# Altium integrated library Weidmueller_OMNIMATE_Signal.IntLib: 2550 symbols (part 20 of 45)
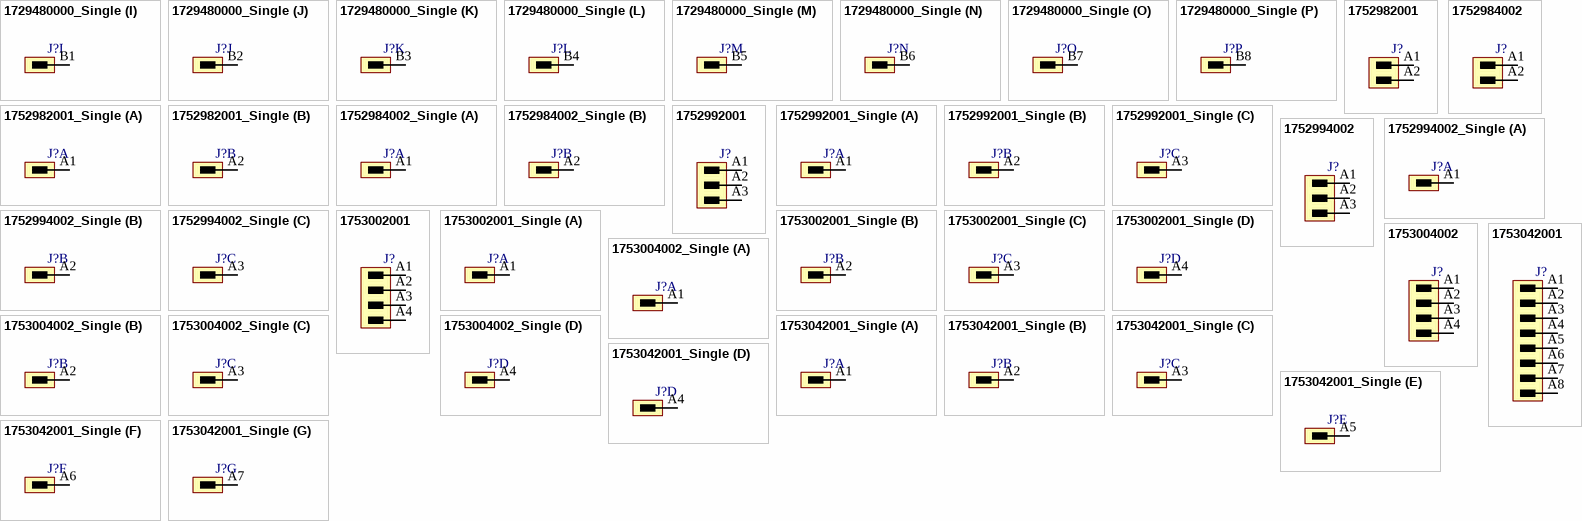
[diagram p230: symbols 1729480000_Single to 1753042001_Single]

## 1752984002_Single
designator J?
OMNIMATE Signal - series BL/SL 3.50; PartNumber: 1752984002; Manufacturer: Weidmueller; Short_text_for_material: SL-SMT 3.50/02/180G 1.5SN BK RL; Side_termination_characteristic: closed side; Mounting_onto_the_PCB: Reflow solder connection; Pitch_mm: 3.5 mm; Pitch_inch: 0.138 inch; No_of_poles: 2; Outgoing_elbow: 180°; Solder_pin_length_mm: 1.5 mm; Contact_surface: tinned; Insulating_material: LCP GF; UL_94_flammability_rating: V-0; Rated_voltage_for_surge_voltage_class_pollution_degree_II_2: 320 V; Rated_current_min_no_of_poles_TU_20_deg_C: 15 A; Rated_voltage_use_group_B_UL_1059: 300 V; Rated_current_use_group_B_UL_1059: 10 A; PackageReference: SL_SMT_3_5_180G_02; Colour: Black; Packaging: Tape; Qty: 265 PCS; Revision: V1; ComponentLink1Description: Manufacturer URL; ComponentLink1URL: http://www.weidmueller.com/; ComponentLink2Description: URL Link1; ComponentLink2URL: http://catalog.weidmueller.com/catalog/Start.do?localeId=en&ObjectID=1752984002
footprint SL_SMT_3_5_180G_02 (OMNIMATE Signal - Serie BL/SL 3.50  SL-SMT 3.50/02/180G 1.5)
part A pins: A1
part B pins: A2

## 1752992001
designator J?
OMNIMATE Signal - series BL/SL 3.50; PartNumber: 1752992001; Manufacturer: Weidmueller; Short_text_for_material: SL-SMT 3.50/03/180G 1.5SN BK BX; Side_termination_characteristic: closed side; Mounting_onto_the_PCB: Reflow solder connection; Pitch_mm: 3.5 mm; Pitch_inch: 0.138 inch; No_of_poles: 3; Outgoing_elbow: 180°; Solder_pin_length_mm: 1.5 mm; Contact_material: CuSn; Contact_surface: tinned; Insulating_material: LCP GF; UL_94_flammability_rating: V-0; Rated_voltage_for_surge_voltage_class_pollution_degree_II_2: 320 V; Rated_voltage_use_group_B_UL_1059: 300 V; Rated_current_use_group_B_UL_1059: 10 A; PackageReference: SL_SMT_3_5_180G_03; Colour: Black; Packaging: Box; Qty: 100 PCS; Revision: V1; ComponentLink1Description: Manufacturer URL; ComponentLink1URL: http://www.weidmueller.com/; ComponentLink2Description: URL Link1; ComponentLink2URL: http://catalog.weidmueller.com/catalog/Start.do?localeId=en&ObjectID=1752992001
footprint SL_SMT_3_5_180G_03 (OMNIMATE Signal - Serie BL/SL 3.50  SL-SMT 3.50/03/180G 1.5)
pins: A1, A2, A3

## 1752992001_Single
designator J?
OMNIMATE Signal - series BL/SL 3.50; PartNumber: 1752992001; Manufacturer: Weidmueller; Short_text_for_material: SL-SMT 3.50/03/180G 1.5SN BK BX; Side_termination_characteristic: closed side; Mounting_onto_the_PCB: Reflow solder connection; Pitch_mm: 3.5 mm; Pitch_inch: 0.138 inch; No_of_poles: 3; Outgoing_elbow: 180°; Solder_pin_length_mm: 1.5 mm; Contact_material: CuSn; Contact_surface: tinned; Insulating_material: LCP GF; UL_94_flammability_rating: V-0; Rated_voltage_for_surge_voltage_class_pollution_degree_II_2: 320 V; Rated_voltage_use_group_B_UL_1059: 300 V; Rated_current_use_group_B_UL_1059: 10 A; PackageReference: SL_SMT_3_5_180G_03; Colour: Black; Packaging: Box; Qty: 100 PCS; Revision: V1; ComponentLink1Description: Manufacturer URL; ComponentLink1URL: http://www.weidmueller.com/; ComponentLink2Description: URL Link1; ComponentLink2URL: http://catalog.weidmueller.com/catalog/Start.do?localeId=en&ObjectID=1752992001
footprint SL_SMT_3_5_180G_03 (OMNIMATE Signal - Serie BL/SL 3.50  SL-SMT 3.50/03/180G 1.5)
part A pins: A1
part B pins: A2
part C pins: A3

## 1752994002
designator J?
OMNIMATE Signal - series BL/SL 3.50; PartNumber: 1752994002; Manufacturer: Weidmueller; Short_text_for_material: SL-SMT 3.50/03/180G 1.5SN BK RL; Side_termination_characteristic: closed side; Mounting_onto_the_PCB: Reflow solder connection; Pitch_mm: 3.5 mm; Pitch_inch: 0.138 inch; No_of_poles: 3; Outgoing_elbow: 180°; Solder_pin_length_mm: 1.5 mm; Contact_surface: tinned; Insulating_material: LCP GF; UL_94_flammability_rating: V-0; Rated_voltage_for_surge_voltage_class_pollution_degree_II_2: 320 V; Rated_current_min_no_of_poles_TU_20_deg_C: 15 A; Rated_voltage_use_group_B_UL_1059: 300 V; Rated_current_use_group_B_UL_1059: 10 A; PackageReference: SL_SMT_3_5_180G_03; Colour: Black; Packaging: Tape; Qty: 265 PCS; Revision: V1; ComponentLink1Description: Manufacturer URL; ComponentLink1URL: http://www.weidmueller.com/; ComponentLink2Description: URL Link1; ComponentLink2URL: http://catalog.weidmueller.com/catalog/Start.do?localeId=en&ObjectID=1752994002
footprint SL_SMT_3_5_180G_03 (OMNIMATE Signal - Serie BL/SL 3.50  SL-SMT 3.50/03/180G 1.5)
pins: A1, A2, A3

## 1752994002_Single
designator J?
OMNIMATE Signal - series BL/SL 3.50; PartNumber: 1752994002; Manufacturer: Weidmueller; Short_text_for_material: SL-SMT 3.50/03/180G 1.5SN BK RL; Side_termination_characteristic: closed side; Mounting_onto_the_PCB: Reflow solder connection; Pitch_mm: 3.5 mm; Pitch_inch: 0.138 inch; No_of_poles: 3; Outgoing_elbow: 180°; Solder_pin_length_mm: 1.5 mm; Contact_surface: tinned; Insulating_material: LCP GF; UL_94_flammability_rating: V-0; Rated_voltage_for_surge_voltage_class_pollution_degree_II_2: 320 V; Rated_current_min_no_of_poles_TU_20_deg_C: 15 A; Rated_voltage_use_group_B_UL_1059: 300 V; Rated_current_use_group_B_UL_1059: 10 A; PackageReference: SL_SMT_3_5_180G_03; Colour: Black; Packaging: Tape; Qty: 265 PCS; Revision: V1; ComponentLink1Description: Manufacturer URL; ComponentLink1URL: http://www.weidmueller.com/; ComponentLink2Description: URL Link1; ComponentLink2URL: http://catalog.weidmueller.com/catalog/Start.do?localeId=en&ObjectID=1752994002
footprint SL_SMT_3_5_180G_03 (OMNIMATE Signal - Serie BL/SL 3.50  SL-SMT 3.50/03/180G 1.5)
part A pins: A1
part B pins: A2
part C pins: A3

## 1753002001
designator J?
OMNIMATE Signal - series BL/SL 3.50; PartNumber: 1753002001; Manufacturer: Weidmueller; Short_text_for_material: SL-SMT 3.50/04/180G 1.5SN BK BX; Side_termination_characteristic: closed side; Mounting_onto_the_PCB: Reflow solder connection; Pitch_mm: 3.5 mm; Pitch_inch: 0.138 inch; No_of_poles: 4; Outgoing_elbow: 180°; Solder_pin_length_mm: 1.5 mm; Contact_material: CuSn; Contact_surface: tinned; Insulating_material: LCP GF; UL_94_flammability_rating: V-0; Rated_voltage_for_surge_voltage_class_pollution_degree_II_2: 320 V; Rated_voltage_use_group_B_UL_1059: 300 V; Rated_current_use_group_B_UL_1059: 10 A; PackageReference: SL_SMT_3_5_180G_04; Colour: Black; Packaging: Box; Qty: 100 PCS; Revision: V1; ComponentLink1Description: Manufacturer URL; ComponentLink1URL: http://www.weidmueller.com/; ComponentLink2Description: URL Link1; ComponentLink2URL: http://catalog.weidmueller.com/catalog/Start.do?localeId=en&ObjectID=1753002001
footprint SL_SMT_3_5_180G_04 (OMNIMATE Signal - Serie BL/SL 3.50  SL-SMT 3.50/04/180G 1.5)
pins: A1, A2, A3, A4

## 1753002001_Single
designator J?
OMNIMATE Signal - series BL/SL 3.50; PartNumber: 1753002001; Manufacturer: Weidmueller; Short_text_for_material: SL-SMT 3.50/04/180G 1.5SN BK BX; Side_termination_characteristic: closed side; Mounting_onto_the_PCB: Reflow solder connection; Pitch_mm: 3.5 mm; Pitch_inch: 0.138 inch; No_of_poles: 4; Outgoing_elbow: 180°; Solder_pin_length_mm: 1.5 mm; Contact_material: CuSn; Contact_surface: tinned; Insulating_material: LCP GF; UL_94_flammability_rating: V-0; Rated_voltage_for_surge_voltage_class_pollution_degree_II_2: 320 V; Rated_voltage_use_group_B_UL_1059: 300 V; Rated_current_use_group_B_UL_1059: 10 A; PackageReference: SL_SMT_3_5_180G_04; Colour: Black; Packaging: Box; Qty: 100 PCS; Revision: V1; ComponentLink1Description: Manufacturer URL; ComponentLink1URL: http://www.weidmueller.com/; ComponentLink2Description: URL Link1; ComponentLink2URL: http://catalog.weidmueller.com/catalog/Start.do?localeId=en&ObjectID=1753002001
footprint SL_SMT_3_5_180G_04 (OMNIMATE Signal - Serie BL/SL 3.50  SL-SMT 3.50/04/180G 1.5)
part A pins: A1
part B pins: A2
part C pins: A3
part D pins: A4

## 1753004002
designator J?
OMNIMATE Signal - series BL/SL 3.50; PartNumber: 1753004002; Manufacturer: Weidmueller; Short_text_for_material: SL-SMT 3.50/04/180G 1.5SN BK RL; Side_termination_characteristic: closed side; Mounting_onto_the_PCB: Reflow solder connection; Pitch_mm: 3.5 mm; Pitch_inch: 0.138 inch; No_of_poles: 4; Outgoing_elbow: 180°; Solder_pin_length_mm: 1.5 mm; Contact_surface: tinned; Insulating_material: LCP GF; UL_94_flammability_rating: V-0; Rated_voltage_for_surge_voltage_class_pollution_degree_II_2: 320 V; Rated_current_min_no_of_poles_TU_20_deg_C: 15 A; Rated_voltage_use_group_B_UL_1059: 300 V; Rated_current_use_group_B_UL_1059: 10 A; PackageReference: SL_SMT_3_5_180G_04; Colour: Black; Packaging: Tape; Qty: 265 PCS; Revision: V1; ComponentLink1Description: Manufacturer URL; ComponentLink1URL: http://www.weidmueller.com/; ComponentLink2Description: URL Link1; ComponentLink2URL: http://catalog.weidmueller.com/catalog/Start.do?localeId=en&ObjectID=1753004002
footprint SL_SMT_3_5_180G_04 (OMNIMATE Signal - Serie BL/SL 3.50  SL-SMT 3.50/04/180G 1.5)
pins: A1, A2, A3, A4

## 1753004002_Single
designator J?
OMNIMATE Signal - series BL/SL 3.50; PartNumber: 1753004002; Manufacturer: Weidmueller; Short_text_for_material: SL-SMT 3.50/04/180G 1.5SN BK RL; Side_termination_characteristic: closed side; Mounting_onto_the_PCB: Reflow solder connection; Pitch_mm: 3.5 mm; Pitch_inch: 0.138 inch; No_of_poles: 4; Outgoing_elbow: 180°; Solder_pin_length_mm: 1.5 mm; Contact_surface: tinned; Insulating_material: LCP GF; UL_94_flammability_rating: V-0; Rated_voltage_for_surge_voltage_class_pollution_degree_II_2: 320 V; Rated_current_min_no_of_poles_TU_20_deg_C: 15 A; Rated_voltage_use_group_B_UL_1059: 300 V; Rated_current_use_group_B_UL_1059: 10 A; PackageReference: SL_SMT_3_5_180G_04; Colour: Black; Packaging: Tape; Qty: 265 PCS; Revision: V1; ComponentLink1Description: Manufacturer URL; ComponentLink1URL: http://www.weidmueller.com/; ComponentLink2Description: URL Link1; ComponentLink2URL: http://catalog.weidmueller.com/catalog/Start.do?localeId=en&ObjectID=1753004002
footprint SL_SMT_3_5_180G_04 (OMNIMATE Signal - Serie BL/SL 3.50  SL-SMT 3.50/04/180G 1.5)
part A pins: A1
part B pins: A2
part C pins: A3
part D pins: A4

## 1753042001
designator J?
OMNIMATE Signal - series BL/SL 3.50; PartNumber: 1753042001; Manufacturer: Weidmueller; Short_text_for_material: SL-SMT 3.50/08/180G 1.5SN BK BX; Side_termination_characteristic: closed side; Mounting_onto_the_PCB: Reflow solder connection; Pitch_mm: 3.5 mm; Pitch_inch: 0.138 inch; No_of_poles: 8; Outgoing_elbow: 180°; Solder_pin_length_mm: 1.5 mm; Contact_material: CuSn; Contact_surface: tinned; Insulating_material: LCP GF; UL_94_flammability_rating: V-0; Rated_voltage_for_surge_voltage_class_pollution_degree_II_2: 320 V; Rated_voltage_use_group_B_UL_1059: 300 V; Rated_current_use_group_B_UL_1059: 10 A; PackageReference: SL_SMT_3_5_180G_08; Colour: Black; Packaging: Box; Qty: 50 PCS; Revision: V1; ComponentLink1Description: Manufacturer URL; ComponentLink1URL: http://www.weidmueller.com/; ComponentLink2Description: URL Link1; ComponentLink2URL: http://catalog.weidmueller.com/catalog/Start.do?localeId=en&ObjectID=1753042001
footprint SL_SMT_3_5_180G_08 (OMNIMATE Signal - Serie BL/SL 3.50  SL-SMT 3.50/08/180G 1.5)
pins: A1, A2, A3, A4, A5, A6, A7, A8

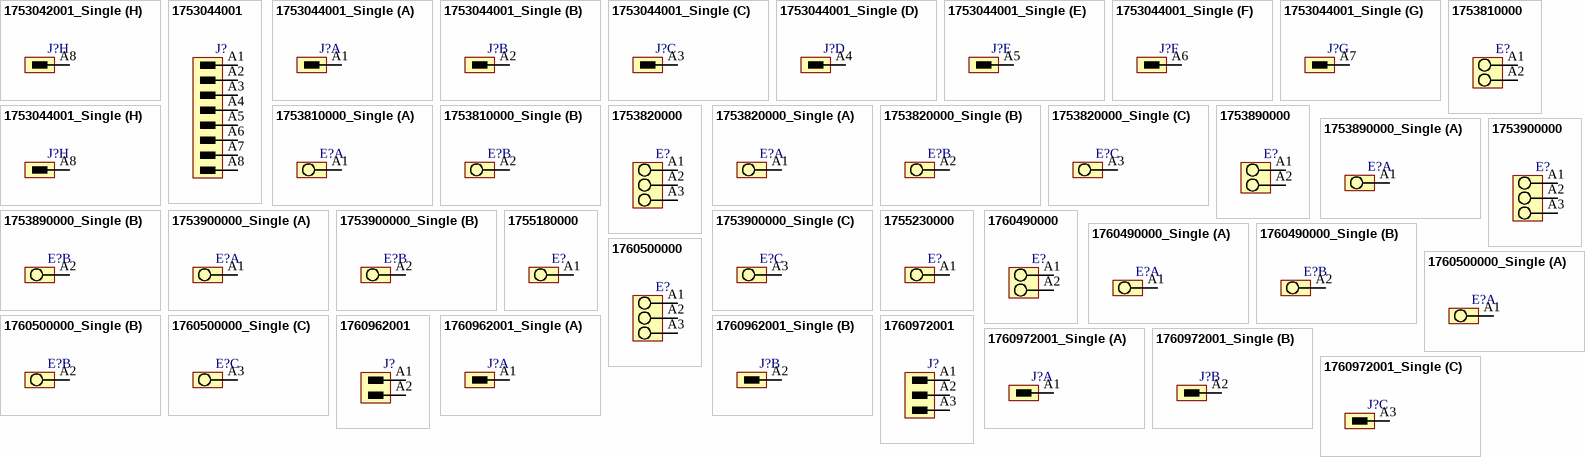
[diagram p110: symbols 1753042001_Single to 1760972001_Single]

## 1753042001_Single
designator J?
OMNIMATE Signal - series BL/SL 3.50; PartNumber: 1753042001; Manufacturer: Weidmueller; Short_text_for_material: SL-SMT 3.50/08/180G 1.5SN BK BX; Side_termination_characteristic: closed side; Mounting_onto_the_PCB: Reflow solder connection; Pitch_mm: 3.5 mm; Pitch_inch: 0.138 inch; No_of_poles: 8; Outgoing_elbow: 180°; Solder_pin_length_mm: 1.5 mm; Contact_material: CuSn; Contact_surface: tinned; Insulating_material: LCP GF; UL_94_flammability_rating: V-0; Rated_voltage_for_surge_voltage_class_pollution_degree_II_2: 320 V; Rated_voltage_use_group_B_UL_1059: 300 V; Rated_current_use_group_B_UL_1059: 10 A; PackageReference: SL_SMT_3_5_180G_08; Colour: Black; Packaging: Box; Qty: 50 PCS; Revision: V1; ComponentLink1Description: Manufacturer URL; ComponentLink1URL: http://www.weidmueller.com/; ComponentLink2Description: URL Link1; ComponentLink2URL: http://catalog.weidmueller.com/catalog/Start.do?localeId=en&ObjectID=1753042001
footprint SL_SMT_3_5_180G_08 (OMNIMATE Signal - Serie BL/SL 3.50  SL-SMT 3.50/08/180G 1.5)
part A pins: A1
part B pins: A2
part C pins: A3
part D pins: A4
part E pins: A5
part F pins: A6
part G pins: A7
part H pins: A8

## 1753044001
designator J?
OMNIMATE Signal - series BL/SL 3.50; PartNumber: 1753044001; Manufacturer: Weidmueller; Short_text_for_material: SL-SMT 3.50/08/180G 1.5SN BK RL; Side_termination_characteristic: closed side; Mounting_onto_the_PCB: Reflow solder connection; Pitch_mm: 3.5 mm; Pitch_inch: 0.138 inch; No_of_poles: 8; Outgoing_elbow: 180°; Solder_pin_length_mm: 1.5 mm; Contact_surface: tinned; Insulating_material: LCP GF; UL_94_flammability_rating: V-0; Rated_voltage_for_surge_voltage_class_pollution_degree_II_2: 320 V; Rated_current_min_no_of_poles_TU_20_deg_C: 15 A; Rated_voltage_use_group_B_UL_1059: 300 V; Rated_current_use_group_B_UL_1059: 10 A; PackageReference: SL_SMT_3_5_180G_08; Colour: Black; Packaging: Tape; Qty: 265 PCS; Revision: V1; ComponentLink1Description: Manufacturer URL; ComponentLink1URL: http://www.weidmueller.com/; ComponentLink2Description: URL Link1; ComponentLink2URL: http://catalog.weidmueller.com/catalog/Start.do?localeId=en&ObjectID=1753044001
footprint SL_SMT_3_5_180G_08 (OMNIMATE Signal - Serie BL/SL 3.50  SL-SMT 3.50/08/180G 1.5)
pins: A1, A2, A3, A4, A5, A6, A7, A8

## 1753044001_Single
designator J?
OMNIMATE Signal - series BL/SL 3.50; PartNumber: 1753044001; Manufacturer: Weidmueller; Short_text_for_material: SL-SMT 3.50/08/180G 1.5SN BK RL; Side_termination_characteristic: closed side; Mounting_onto_the_PCB: Reflow solder connection; Pitch_mm: 3.5 mm; Pitch_inch: 0.138 inch; No_of_poles: 8; Outgoing_elbow: 180°; Solder_pin_length_mm: 1.5 mm; Contact_surface: tinned; Insulating_material: LCP GF; UL_94_flammability_rating: V-0; Rated_voltage_for_surge_voltage_class_pollution_degree_II_2: 320 V; Rated_current_min_no_of_poles_TU_20_deg_C: 15 A; Rated_voltage_use_group_B_UL_1059: 300 V; Rated_current_use_group_B_UL_1059: 10 A; PackageReference: SL_SMT_3_5_180G_08; Colour: Black; Packaging: Tape; Qty: 265 PCS; Revision: V1; ComponentLink1Description: Manufacturer URL; ComponentLink1URL: http://www.weidmueller.com/; ComponentLink2Description: URL Link1; ComponentLink2URL: http://catalog.weidmueller.com/catalog/Start.do?localeId=en&ObjectID=1753044001
footprint SL_SMT_3_5_180G_08 (OMNIMATE Signal - Serie BL/SL 3.50  SL-SMT 3.50/08/180G 1.5)
part A pins: A1
part B pins: A2
part C pins: A3
part D pins: A4
part E pins: A5
part F pins: A6
part G pins: A7
part H pins: A8

## 1753810000
designator E?
OMNIMATE Signal - series LP; PartNumber: 1753810000; Manufacturer: Weidmueller; Short_text_for_material: LP 5.08/02/180 3.2SN OR BX; Side_termination_characteristic: closed side; Mounting_onto_the_PCB: Solder connection; Pitch_mm: 5,08 mm; Pitch_inch: 0,2 inch; No_of_poles: 2; Solder_pin_length_mm: 3,2 mm; Contact_material: Cu-Leg; Contact_surface: tinned; Insulating_material: PA; UL_94_flammability_rating: V-2; Rated_voltage_for_surge_voltage_class_pollution_degree_II_2: 500 V; Solid_min_H05_07_V_U: 0,5 mm²; Solid_max_H05_07_V_U: 6 mm²; Rated_voltage_use_group_B_UL_1059: 300 V; Rated_current_use_group_B_UL_1059: 20 A; Wire_cross_section_AWG_min_UL_1059: AWG 26; Wire_cross_section_AWG_max_UL_1059: AWG 12; PackageReference: LP_5_08_180_02; Colour: Orange; Packaging: Box; Qty: 100 PCS; Revision: V1; ComponentLink1Description: Manufacturer URL; ComponentLink1URL: http://www.weidmueller.com/; ComponentLink2Description: URL Link1; ComponentLink2URL: http://catalog.weidmueller.com/catalog/Start.do?localeId=en&ObjectID=1753810000
footprint LP_5_08_180_02 (OMNIMATE Signal - Serie LP  LP 5.08/02/180 3.2)
pins: A1, A2
1 alternate drawing of the same symbol

## 1753810000_Single
designator E?
OMNIMATE Signal - series LP; PartNumber: 1753810000; Manufacturer: Weidmueller; Short_text_for_material: LP 5.08/02/180 3.2SN OR BX; Side_termination_characteristic: closed side; Mounting_onto_the_PCB: Solder connection; Pitch_mm: 5,08 mm; Pitch_inch: 0,2 inch; No_of_poles: 2; Solder_pin_length_mm: 3,2 mm; Contact_material: Cu-Leg; Contact_surface: tinned; Insulating_material: PA; UL_94_flammability_rating: V-2; Rated_voltage_for_surge_voltage_class_pollution_degree_II_2: 500 V; Solid_min_H05_07_V_U: 0,5 mm²; Solid_max_H05_07_V_U: 6 mm²; Rated_voltage_use_group_B_UL_1059: 300 V; Rated_current_use_group_B_UL_1059: 20 A; Wire_cross_section_AWG_min_UL_1059: AWG 26; Wire_cross_section_AWG_max_UL_1059: AWG 12; PackageReference: LP_5_08_180_02; Colour: Orange; Packaging: Box; Qty: 100 PCS; Revision: V1; ComponentLink1Description: Manufacturer URL; ComponentLink1URL: http://www.weidmueller.com/; ComponentLink2Description: URL Link1; ComponentLink2URL: http://catalog.weidmueller.com/catalog/Start.do?localeId=en&ObjectID=1753810000
footprint LP_5_08_180_02 (OMNIMATE Signal - Serie LP  LP 5.08/02/180 3.2)
part A pins: A1
part B pins: A2
1 alternate drawing of the same symbol

## 1753820000
designator E?
OMNIMATE Signal - series LP; PartNumber: 1753820000; Manufacturer: Weidmueller; Short_text_for_material: LP 5.08/03/180 3.2SN OR BX; Side_termination_characteristic: closed side; Mounting_onto_the_PCB: Solder connection; Pitch_mm: 5,08 mm; Pitch_inch: 0,2 inch; No_of_poles: 3; Solder_pin_length_mm: 3,2 mm; Contact_material: Cu-Leg; Contact_surface: tinned; Insulating_material: PA; UL_94_flammability_rating: V-2; Rated_voltage_for_surge_voltage_class_pollution_degree_II_2: 500 V; Solid_min_H05_07_V_U: 0,5 mm²; Solid_max_H05_07_V_U: 6 mm²; Rated_voltage_use_group_B_UL_1059: 300 V; Rated_current_use_group_B_UL_1059: 20 A; Wire_cross_section_AWG_min_UL_1059: AWG 26; Wire_cross_section_AWG_max_UL_1059: AWG 12; PackageReference: LP_5_08_180_03; Colour: Orange; Packaging: Box; Qty: 100 PCS; Revision: V1; ComponentLink1Description: Manufacturer URL; ComponentLink1URL: http://www.weidmueller.com/; ComponentLink2Description: URL Link1; ComponentLink2URL: http://catalog.weidmueller.com/catalog/Start.do?localeId=en&ObjectID=1753820000
footprint LP_5_08_180_03 (OMNIMATE Signal - Serie LP  LP 5.08/03/180 3.2)
pins: A1, A2, A3
1 alternate drawing of the same symbol

## 1753820000_Single
designator E?
OMNIMATE Signal - series LP; PartNumber: 1753820000; Manufacturer: Weidmueller; Short_text_for_material: LP 5.08/03/180 3.2SN OR BX; Side_termination_characteristic: closed side; Mounting_onto_the_PCB: Solder connection; Pitch_mm: 5,08 mm; Pitch_inch: 0,2 inch; No_of_poles: 3; Solder_pin_length_mm: 3,2 mm; Contact_material: Cu-Leg; Contact_surface: tinned; Insulating_material: PA; UL_94_flammability_rating: V-2; Rated_voltage_for_surge_voltage_class_pollution_degree_II_2: 500 V; Solid_min_H05_07_V_U: 0,5 mm²; Solid_max_H05_07_V_U: 6 mm²; Rated_voltage_use_group_B_UL_1059: 300 V; Rated_current_use_group_B_UL_1059: 20 A; Wire_cross_section_AWG_min_UL_1059: AWG 26; Wire_cross_section_AWG_max_UL_1059: AWG 12; PackageReference: LP_5_08_180_03; Colour: Orange; Packaging: Box; Qty: 100 PCS; Revision: V1; ComponentLink1Description: Manufacturer URL; ComponentLink1URL: http://www.weidmueller.com/; ComponentLink2Description: URL Link1; ComponentLink2URL: http://catalog.weidmueller.com/catalog/Start.do?localeId=en&ObjectID=1753820000
footprint LP_5_08_180_03 (OMNIMATE Signal - Serie LP  LP 5.08/03/180 3.2)
part A pins: A1
part B pins: A2
part C pins: A3
1 alternate drawing of the same symbol

## 1753890000
designator E?
OMNIMATE Signal - series LP; PartNumber: 1753890000; Manufacturer: Weidmueller; Short_text_for_material: LP 7.62/02/180 3.2SN OR BX; Side_termination_characteristic: closed side; Mounting_onto_the_PCB: Solder connection; Pitch_mm: 7,62 mm; Pitch_inch: 0,3 inch; No_of_poles: 2; Solder_pin_length_mm: 3,2 mm; Contact_material: Cu-Leg; Contact_surface: tinned; Insulating_material: PA; UL_94_flammability_rating: V-2; Rated_voltage_for_surge_voltage_class_pollution_degree_II_2: 1000 V; Solid_min_H05_07_V_U: 0,5 mm²; Solid_max_H05_07_V_U: 6 mm²; Rated_voltage_use_group_B_UL_1059: 300 V; Rated_current_use_group_B_UL_1059: 20 A; Wire_cross_section_AWG_min_UL_1059: AWG 26; Wire_cross_section_AWG_max_UL_1059: AWG 12; PackageReference: LP_7_62_180_02; Colour: Orange; Packaging: Box; Qty: 100 PCS; Revision: V1; ComponentLink1Description: Manufacturer URL; ComponentLink1URL: http://www.weidmueller.com/; ComponentLink2Description: URL Link1; ComponentLink2URL: http://catalog.weidmueller.com/catalog/Start.do?localeId=en&ObjectID=1753890000
footprint LP_7_62_180_02 (OMNIMATE Signal - Serie LP  LP 7.62/02/180 3.2)
pins: A1, A2
1 alternate drawing of the same symbol

## 1753890000_Single
designator E?
OMNIMATE Signal - series LP; PartNumber: 1753890000; Manufacturer: Weidmueller; Short_text_for_material: LP 7.62/02/180 3.2SN OR BX; Side_termination_characteristic: closed side; Mounting_onto_the_PCB: Solder connection; Pitch_mm: 7,62 mm; Pitch_inch: 0,3 inch; No_of_poles: 2; Solder_pin_length_mm: 3,2 mm; Contact_material: Cu-Leg; Contact_surface: tinned; Insulating_material: PA; UL_94_flammability_rating: V-2; Rated_voltage_for_surge_voltage_class_pollution_degree_II_2: 1000 V; Solid_min_H05_07_V_U: 0,5 mm²; Solid_max_H05_07_V_U: 6 mm²; Rated_voltage_use_group_B_UL_1059: 300 V; Rated_current_use_group_B_UL_1059: 20 A; Wire_cross_section_AWG_min_UL_1059: AWG 26; Wire_cross_section_AWG_max_UL_1059: AWG 12; PackageReference: LP_7_62_180_02; Colour: Orange; Packaging: Box; Qty: 100 PCS; Revision: V1; ComponentLink1Description: Manufacturer URL; ComponentLink1URL: http://www.weidmueller.com/; ComponentLink2Description: URL Link1; ComponentLink2URL: http://catalog.weidmueller.com/catalog/Start.do?localeId=en&ObjectID=1753890000
footprint LP_7_62_180_02 (OMNIMATE Signal - Serie LP  LP 7.62/02/180 3.2)
part A pins: A1
part B pins: A2
1 alternate drawing of the same symbol

## 1753900000
designator E?
OMNIMATE Signal - series LP; PartNumber: 1753900000; Manufacturer: Weidmueller; Short_text_for_material: LP 7.62/03/180 3.2SN OR BX; Side_termination_characteristic: closed side; Mounting_onto_the_PCB: Solder connection; Pitch_mm: 7,62 mm; Pitch_inch: 0,3 inch; No_of_poles: 3; Solder_pin_length_mm: 3,2 mm; Contact_material: Cu-Leg; Contact_surface: tinned; Insulating_material: PA; UL_94_flammability_rating: V-2; Rated_voltage_for_surge_voltage_class_pollution_degree_II_2: 1000 V; Solid_min_H05_07_V_U: 0,5 mm²; Solid_max_H05_07_V_U: 6 mm²; Rated_voltage_use_group_B_UL_1059: 300 V; Rated_current_use_group_B_UL_1059: 20 A; Wire_cross_section_AWG_min_UL_1059: AWG 26; Wire_cross_section_AWG_max_UL_1059: AWG 12; PackageReference: LP_7_62_180_03; Colour: Orange; Packaging: Box; Qty: 100 PCS; Revision: V1; ComponentLink1Description: Manufacturer URL; ComponentLink1URL: http://www.weidmueller.com/; ComponentLink2Description: URL Link1; ComponentLink2URL: http://catalog.weidmueller.com/catalog/Start.do?localeId=en&ObjectID=1753900000
footprint LP_7_62_180_03 (OMNIMATE Signal - Serie LP  LP 7.62/03/180 3.2)
pins: A1, A2, A3
1 alternate drawing of the same symbol

## 1753900000_Single
designator E?
OMNIMATE Signal - series LP; PartNumber: 1753900000; Manufacturer: Weidmueller; Short_text_for_material: LP 7.62/03/180 3.2SN OR BX; Side_termination_characteristic: closed side; Mounting_onto_the_PCB: Solder connection; Pitch_mm: 7,62 mm; Pitch_inch: 0,3 inch; No_of_poles: 3; Solder_pin_length_mm: 3,2 mm; Contact_material: Cu-Leg; Contact_surface: tinned; Insulating_material: PA; UL_94_flammability_rating: V-2; Rated_voltage_for_surge_voltage_class_pollution_degree_II_2: 1000 V; Solid_min_H05_07_V_U: 0,5 mm²; Solid_max_H05_07_V_U: 6 mm²; Rated_voltage_use_group_B_UL_1059: 300 V; Rated_current_use_group_B_UL_1059: 20 A; Wire_cross_section_AWG_min_UL_1059: AWG 26; Wire_cross_section_AWG_max_UL_1059: AWG 12; PackageReference: LP_7_62_180_03; Colour: Orange; Packaging: Box; Qty: 100 PCS; Revision: V1; ComponentLink1Description: Manufacturer URL; ComponentLink1URL: http://www.weidmueller.com/; ComponentLink2Description: URL Link1; ComponentLink2URL: http://catalog.weidmueller.com/catalog/Start.do?localeId=en&ObjectID=1753900000
footprint LP_7_62_180_03 (OMNIMATE Signal - Serie LP  LP 7.62/03/180 3.2)
part A pins: A1
part B pins: A2
part C pins: A3
1 alternate drawing of the same symbol

## 1755180000
designator E?
OMNIMATE Signal - series LP; PartNumber: 1755180000; Manufacturer: Weidmueller; Short_text_for_material: LPTR 5.08/01/90 3.2SN OR BX; Side_termination_characteristic: closed side; Mounting_onto_the_PCB: Solder connection; Pitch_mm: 5,08 mm; Pitch_inch: 0,2 inch; No_of_poles: 1; Solder_pin_length_mm: 3,2 mm; Contact_material: Cu-Leg; Contact_surface: tinned; Insulating_material: PA; UL_94_flammability_rating: V-2; Rated_voltage_for_surge_voltage_class_pollution_degree_II_2: 500 V; Solid_min_H05_07_V_U: 0,5 mm²; Solid_max_H05_07_V_U: 6 mm²; Rated_voltage_use_group_B_UL_1059: 300 V; Rated_current_use_group_B_UL_1059: 15 A; Wire_cross_section_AWG_min_UL_1059: AWG 26; Wire_cross_section_AWG_max_UL_1059: AWG 12; PackageReference: LPTR_5_08_32_01; Colour: Orange; Packaging: Box; Qty: 100 PCS; Revision: V1; ComponentLink1Description: Manufacturer URL; ComponentLink1URL: http://www.weidmueller.com/; ComponentLink2Description: URL Link1; ComponentLink2URL: http://catalog.weidmueller.com/catalog/Start.do?localeId=en&ObjectID=1755180000
footprint LPTR_5_08_32_01 (OMNIMATE Signal - Serie LP  LPTR 5.08/01/90 3.2)
pins: A1
1 alternate drawing of the same symbol

## 1755230000
designator E?
OMNIMATE Signal - series LP; PartNumber: 1755230000; Manufacturer: Weidmueller; Short_text_for_material: LPTR 5.08/01/90 4.5SN OR BX; Side_termination_characteristic: closed side; Mounting_onto_the_PCB: Solder connection; Pitch_mm: 5,08 mm; Pitch_inch: 0,2 inch; No_of_poles: 1; Solder_pin_length_mm: 4,5 mm; Contact_material: Cu-Leg; Contact_surface: tinned; Insulating_material: PA; UL_94_flammability_rating: V-2; Rated_voltage_for_surge_voltage_class_pollution_degree_II_2: 500 V; Solid_min_H05_07_V_U: 0,5 mm²; Solid_max_H05_07_V_U: 6 mm²; Rated_voltage_use_group_B_UL_1059: 300 V; Rated_current_use_group_B_UL_1059: 15 A; Wire_cross_section_AWG_min_UL_1059: AWG 26; Wire_cross_section_AWG_max_UL_1059: AWG 12; PackageReference: LPTR_5_08_45_01; Colour: Orange; Packaging: Box; Qty: 100 PCS; Revision: V1; ComponentLink1Description: Manufacturer URL; ComponentLink1URL: http://www.weidmueller.com/; ComponentLink2Description: URL Link1; ComponentLink2URL: http://catalog.weidmueller.com/catalog/Start.do?localeId=en&ObjectID=1755230000
footprint LPTR_5_08_45_01 (OMNIMATE Signal - Serie LP  LPTR 5.08/01/90 4.5)
pins: A1
1 alternate drawing of the same symbol

## 1760490000
designator E?
OMNIMATE Signal - series PM; PartNumber: 1760490000; Manufacturer: Weidmueller; Short_text_for_material: PM 5.08/02/90 3.5SN OR BX; Side_termination_characteristic: closed side; Mounting_onto_the_PCB: Solder connection; Pitch_mm: 5,08 mm; Pitch_inch: 0,2 inch; No_of_poles: 2; Solder_pin_length_mm: 3,5 mm; Contact_material: Cu-Leg; Contact_surface: tinned; Insulating_material: Wemid (PA); UL_94_flammability_rating: V-0; Rated_voltage_for_surge_voltage_class_pollution_degree_II_2: 600 V; Solid_min_H05_07_V_U: 0,13 mm²; Solid_max_H05_07_V_U: 2,5 mm²; Rated_voltage_use_group_B_UL_1059: 300 V; Rated_current_use_group_B_UL_1059: 15 A; Wire_cross_section_AWG_min_UL_1059: AWG 26; Wire_cross_section_AWG_max_UL_1059: AWG 14; PackageReference: PM_5_08_90_02; Colour: Orange; Packaging: Box; Qty: 500 PCS; Revision: V1; ComponentLink1Description: Manufacturer URL; ComponentLink1URL: http://www.weidmueller.com/; ComponentLink2Description: URL Link1; ComponentLink2URL: http://catalog.weidmueller.com/catalog/Start.do?localeId=en&ObjectID=1760490000
footprint PM_5_08_90_02 (PM 5.08/02/90 3.5)
pins: A1, A2
1 alternate drawing of the same symbol

## 1760490000_Single
designator E?
OMNIMATE Signal - series PM; PartNumber: 1760490000; Manufacturer: Weidmueller; Short_text_for_material: PM 5.08/02/90 3.5SN OR BX; Side_termination_characteristic: closed side; Mounting_onto_the_PCB: Solder connection; Pitch_mm: 5,08 mm; Pitch_inch: 0,2 inch; No_of_poles: 2; Solder_pin_length_mm: 3,5 mm; Contact_material: Cu-Leg; Contact_surface: tinned; Insulating_material: Wemid (PA); UL_94_flammability_rating: V-0; Rated_voltage_for_surge_voltage_class_pollution_degree_II_2: 600 V; Solid_min_H05_07_V_U: 0,13 mm²; Solid_max_H05_07_V_U: 2,5 mm²; Rated_voltage_use_group_B_UL_1059: 300 V; Rated_current_use_group_B_UL_1059: 15 A; Wire_cross_section_AWG_min_UL_1059: AWG 26; Wire_cross_section_AWG_max_UL_1059: AWG 14; PackageReference: PM_5_08_90_02; Colour: Orange; Packaging: Box; Qty: 500 PCS; Revision: V1; ComponentLink1Description: Manufacturer URL; ComponentLink1URL: http://www.weidmueller.com/; ComponentLink2Description: URL Link1; ComponentLink2URL: http://catalog.weidmueller.com/catalog/Start.do?localeId=en&ObjectID=1760490000
footprint PM_5_08_90_02 (PM 5.08/02/90 3.5)
part A pins: A1
part B pins: A2
1 alternate drawing of the same symbol

## 1760500000
designator E?
OMNIMATE Signal - series PM; PartNumber: 1760500000; Manufacturer: Weidmueller; Short_text_for_material: PM 5.08/03/90 3.5SN OR BX; Side_termination_characteristic: closed side; Mounting_onto_the_PCB: Solder connection; Pitch_mm: 5,08 mm; Pitch_inch: 0,2 inch; No_of_poles: 3; Solder_pin_length_mm: 3,5 mm; Contact_material: Cu-Leg; Contact_surface: tinned; Insulating_material: Wemid (PA); UL_94_flammability_rating: V-0; Rated_voltage_for_surge_voltage_class_pollution_degree_II_2: 600 V; Solid_min_H05_07_V_U: 0,13 mm²; Solid_max_H05_07_V_U: 2,5 mm²; Rated_voltage_use_group_B_UL_1059: 300 V; Rated_current_use_group_B_UL_1059: 15 A; Wire_cross_section_AWG_min_UL_1059: AWG 26; Wire_cross_section_AWG_max_UL_1059: AWG 14; PackageReference: PM_5_08_90_03; Colour: Orange; Packaging: Box; Qty: 500 PCS; Revision: V1; ComponentLink1Description: Manufacturer URL; ComponentLink1URL: http://www.weidmueller.com/; ComponentLink2Description: URL Link1; ComponentLink2URL: http://catalog.weidmueller.com/catalog/Start.do?localeId=en&ObjectID=1760500000
footprint PM_5_08_90_03 (PM 5.08/03/90 3.5)
pins: A1, A2, A3
1 alternate drawing of the same symbol

## 1760500000_Single
designator E?
OMNIMATE Signal - series PM; PartNumber: 1760500000; Manufacturer: Weidmueller; Short_text_for_material: PM 5.08/03/90 3.5SN OR BX; Side_termination_characteristic: closed side; Mounting_onto_the_PCB: Solder connection; Pitch_mm: 5,08 mm; Pitch_inch: 0,2 inch; No_of_poles: 3; Solder_pin_length_mm: 3,5 mm; Contact_material: Cu-Leg; Contact_surface: tinned; Insulating_material: Wemid (PA); UL_94_flammability_rating: V-0; Rated_voltage_for_surge_voltage_class_pollution_degree_II_2: 600 V; Solid_min_H05_07_V_U: 0,13 mm²; Solid_max_H05_07_V_U: 2,5 mm²; Rated_voltage_use_group_B_UL_1059: 300 V; Rated_current_use_group_B_UL_1059: 15 A; Wire_cross_section_AWG_min_UL_1059: AWG 26; Wire_cross_section_AWG_max_UL_1059: AWG 14; PackageReference: PM_5_08_90_03; Colour: Orange; Packaging: Box; Qty: 500 PCS; Revision: V1; ComponentLink1Description: Manufacturer URL; ComponentLink1URL: http://www.weidmueller.com/; ComponentLink2Description: URL Link1; ComponentLink2URL: http://catalog.weidmueller.com/catalog/Start.do?localeId=en&ObjectID=1760500000
footprint PM_5_08_90_03 (PM 5.08/03/90 3.5)
part A pins: A1
part B pins: A2
part C pins: A3
1 alternate drawing of the same symbol

## 1760962001
designator J?
OMNIMATE Signal - series BL/SL 3.50; PartNumber: 1760962001; Manufacturer: Weidmueller; Short_text_for_material: SL-SMT 3.50/02/180F 1.5SN BK BX; Side_termination_characteristic: Flange; Mounting_onto_the_PCB: Reflow solder connection; Pitch_mm: 3.5 mm; Pitch_inch: 0.138 inch; No_of_poles: 2; Outgoing_elbow: 180°; Solder_pin_length_mm: 1.5 mm; Contact_material: CuSn; Contact_surface: tinned; Insulating_material: LCP GF; UL_94_flammability_rating: V-0; Rated_voltage_for_surge_voltage_class_pollution_degree_II_2: 320 V; Rated_voltage_use_group_B_UL_1059: 300 V; Rated_current_use_group_B_UL_1059: 10 A; PackageReference: SL_SMT_3_5_180F_02; Colour: Black; Packaging: Box; Qty: 100 PCS; Revision: V1; ComponentLink1Description: Manufacturer URL; ComponentLink1URL: http://www.weidmueller.com/; ComponentLink2Description: URL Link1; ComponentLink2URL: http://catalog.weidmueller.com/catalog/Start.do?localeId=en&ObjectID=1760962001
footprint SL_SMT_3_5_180F_02 (OMNIMATE Signal - Serie BL/SL 3.50  SL-SMT 3.50/02/180F 1.5)
pins: A1, A2

## 1760962001_Single
designator J?
OMNIMATE Signal - series BL/SL 3.50; PartNumber: 1760962001; Manufacturer: Weidmueller; Short_text_for_material: SL-SMT 3.50/02/180F 1.5SN BK BX; Side_termination_characteristic: Flange; Mounting_onto_the_PCB: Reflow solder connection; Pitch_mm: 3.5 mm; Pitch_inch: 0.138 inch; No_of_poles: 2; Outgoing_elbow: 180°; Solder_pin_length_mm: 1.5 mm; Contact_material: CuSn; Contact_surface: tinned; Insulating_material: LCP GF; UL_94_flammability_rating: V-0; Rated_voltage_for_surge_voltage_class_pollution_degree_II_2: 320 V; Rated_voltage_use_group_B_UL_1059: 300 V; Rated_current_use_group_B_UL_1059: 10 A; PackageReference: SL_SMT_3_5_180F_02; Colour: Black; Packaging: Box; Qty: 100 PCS; Revision: V1; ComponentLink1Description: Manufacturer URL; ComponentLink1URL: http://www.weidmueller.com/; ComponentLink2Description: URL Link1; ComponentLink2URL: http://catalog.weidmueller.com/catalog/Start.do?localeId=en&ObjectID=1760962001
footprint SL_SMT_3_5_180F_02 (OMNIMATE Signal - Serie BL/SL 3.50  SL-SMT 3.50/02/180F 1.5)
part A pins: A1
part B pins: A2

## 1760972001
designator J?